# Altium footprint library ConnectMedical_BAC.PcbLib: 83 footprints (part 5 of 6)
Each footprint in its own frame and in the unit in brackets; x right, y up, seen from the top. Pads: shape width x height; smd on the part's side, far side on the other; paste and mask are expansions set on the pad; w line width, h text height; cw(c..) or ccw(c..) is an arc to the next point about the centre after c.
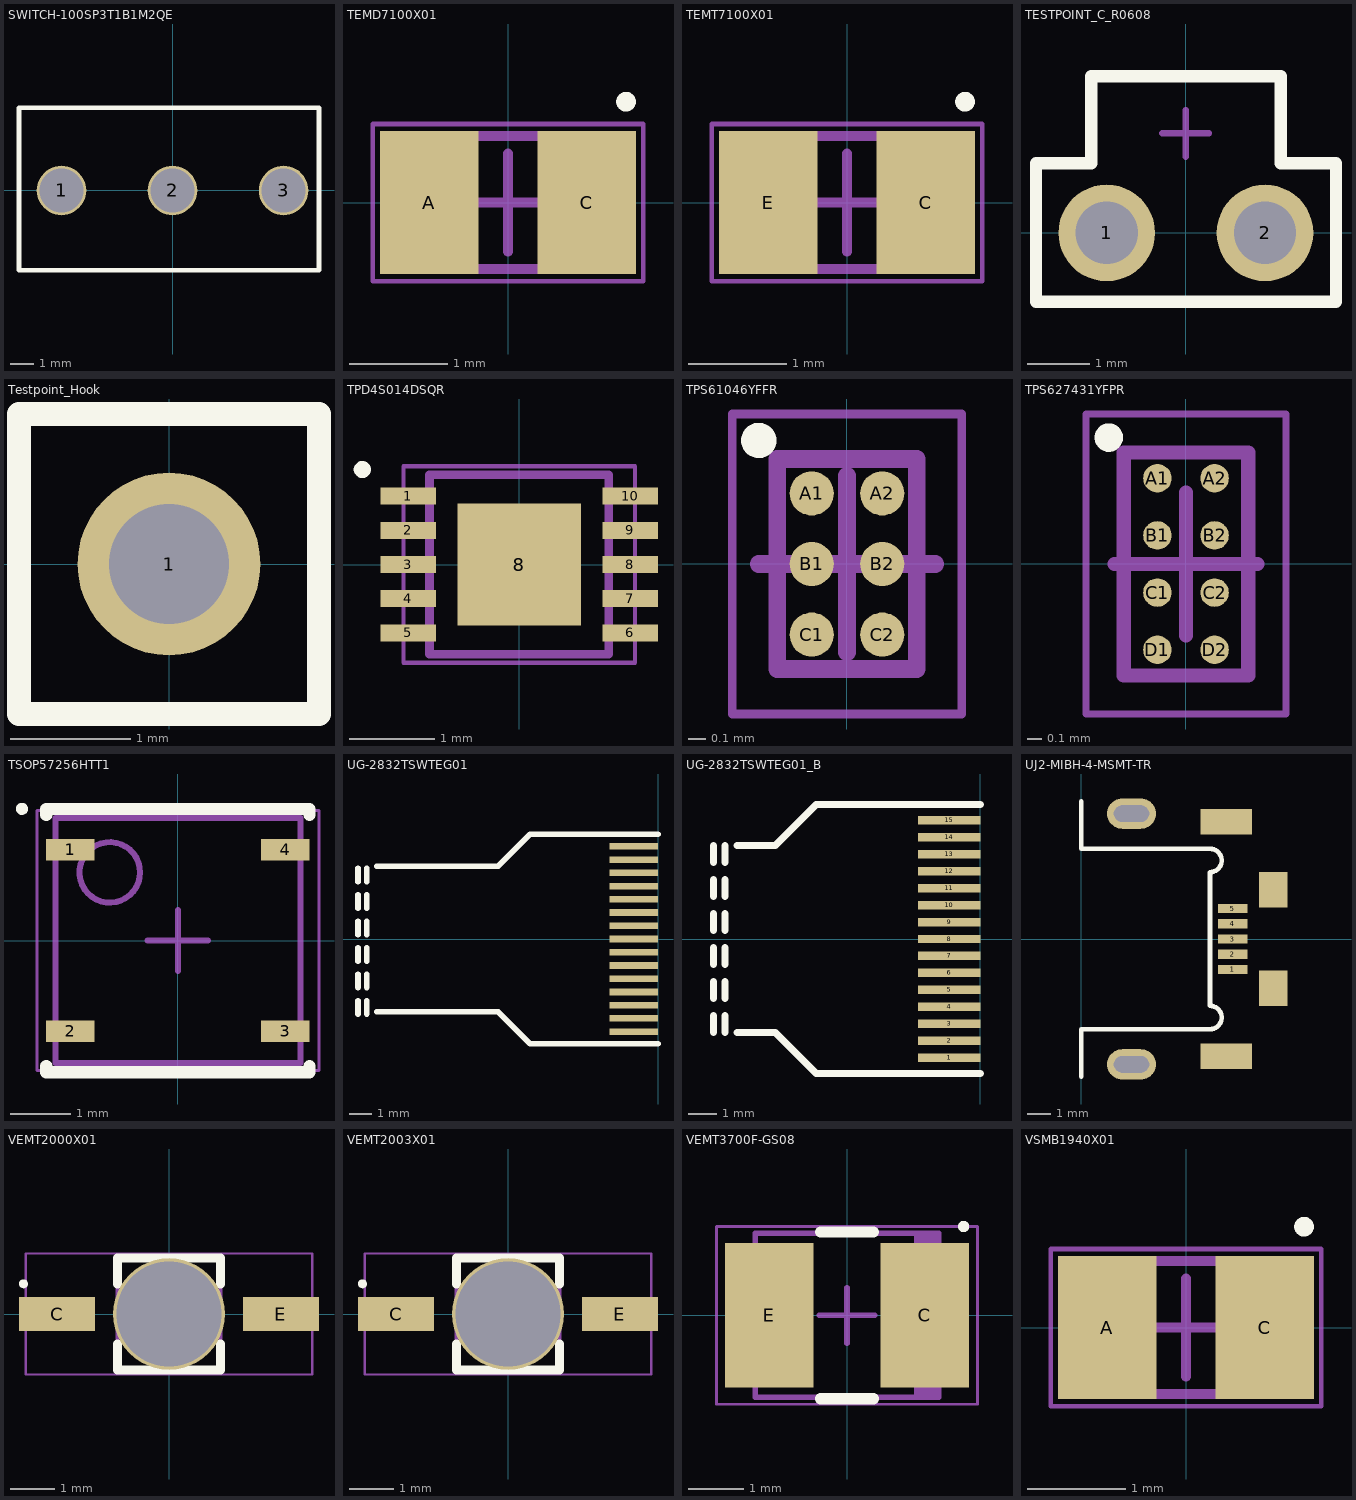
[diagram p4: the footprints below, top view; thin cyan lines are the x and y axes]

## SWITCH-100SP3T1B1M2QE [mm] "SWITCH TOGGLE SPDT"
pads (3):
  round 2.1 hole 1.85 paste-3 mask+0.1: 1(-4.7,0) 2(0,0) 3(4.7,0)
Top Overlay:
  lines w0.2: -6.5,-3.375 6.2,-3.375 6.2,3.5 -6.5,3.5 -6.5,-3.375
3D body "100SPxT1B1M2xE.stp": height 29.46, standoff -5.06, extent -6.5,-3.38 6.2,3.48

## TEMD7100X01 [mm] "Silicon PIN Photodiode, 2-Leads, Body 2.00x1.25mm, IPC High Density"
height 0.95
pads (2):
  rect 1x1.45 smd: A(-0.8,0) C(0.8,0)
Top Overlay:
  circle w0.1: c1.2,1.025 r0.05
Mechanical 13:
  rectangle: 0.768,-0.675 1.05,0.675
  lines w0.1: -1.05,-0.675 1.05,-0.675 1.05,0.675 -1.05,0.675 -1.05,-0.675
Mechanical 15:
  lines w0.05: -1.375,-0.8 1.375,-0.8 1.375,0.8 -1.375,0.8 -1.375,-0.8
  lines w0.1: -0.5,0 0.5,0 ; 0,-0.5 0,0.5
3D body "TEMD7100X01 .step": height 0.95, standoff 0, extent -1.27,-0.675 1.27,0.675

## TEMT7100X01 [mm] "Silicon Phototransistor in 0805 Package, 2-Leads, Body 2.00x1.25mm, IPC High Density"
height 0.95
pads (2):
  rect 1x1.45 smd: C(0.8,0) E(-0.8,0)
Top Overlay:
  circle w0.1: c1.2,1.025 r0.05
Mechanical 13:
  rectangle: 0.768,-0.675 1.05,0.675
  lines w0.1: -1.05,-0.675 1.05,-0.675 1.05,0.675 -1.05,0.675 -1.05,-0.675
Mechanical 15:
  lines w0.05: -1.375,-0.8 1.375,-0.8 1.375,0.8 -1.375,0.8 -1.375,-0.8
  lines w0.1: -0.5,0 0.5,0 ; 0,-0.5 0,0.5
3D body "TEMD7100X01 .step": height 0.95, standoff 0, extent -1.27,-0.675 1.27,0.675

## TESTPOINT_C_R0608 [mm] "Testpoint current"
pads (2):
  round 1.55 hole 1 paste-3 mask+0.1: 1(-1.27,0) 2(1.27,0)
Top Overlay:
  lines w0.2: -2.405,-1.107 2.408,-1.107 2.408,1.115 1.52,1.115 1.52,2.516 -1.52,2.516 -1.52,1.115 -2.405,1.115 -2.405,-1.107
Mechanical 15:
  lines w0.05: -1.353,2.447 1.347,2.447
  lines w0.1: -0.378,1.597 0.372,1.597 ; -0.003,1.222 -0.003,1.972

## Testpoint_Hook [mil] "Testpoints"
pads (1):
  round 60 hole 39.37: 1(0,0)
Top Overlay:
  lines w7.87: -49.21,-49.21 -49.21,49.21 49.21,49.21 49.21,-49.21 -49.21,-49.21
3D body "TEST POINT GRY Keystone 5118.STEP": height 192.34, standoff -121.02, extent -49.99,-49.99 50.01,50.01

## TPD4S014DSQR [mm] "IC USB PORT PROTECTION 10SON"
height 0.8
pads (11):
  rect 0.65x0.2 smd mask+0.07: 1(-1.3,0.8) 2(-1.3,0.4) 3(-1.3,0) 4(-1.3,-0.4) 5(-1.3,-0.8) 6(1.3,-0.8) 7(1.3,-0.4) 8(1.3,0) 9(1.3,0.4) 10(1.3,0.8)
  rect 1.45x1.43 smd mask+0.07: 8(0,0)
Top Overlay:
  circle w0.1: c-1.837,1.112 r0.05
Mechanical 13:
  circle w0.1: c-0.25,0.25 r0.4
  lines w0.1: -1.05,-1.05 -1.05,1.05 1.05,1.05 1.05,-1.05 -1.05,-1.05
Mechanical 15:
  lines w0.05: -1.355,-1.15 -1.355,1.15 1.355,1.15 1.355,-1.15 -1.355,-1.15
  lines w0.1: -0.5,0 0.5,0 ; 0,-0.5 0,0.5
3D body "TPD4S014DSQR.step": height 0.8, standoff 0, extent -1.1,-1.05 1.1,1.05

## TPS61046YFFR [mm] "IC LED DRVR RGLTR DIM"
height 0.63
pads (6):
  round 0.25 smd mask+0.07: A1(-0.2,0.4) A2(0.2,0.4) B1(-0.2,0) B2(0.2,0) C1(-0.2,-0.4) C2(0.2,-0.4)
Top Overlay:
  circle w0.1: c-0.5,0.7 r0.05
Mechanical 13:
  lines w0.1: -0.395,-0.595 -0.395,0.595 0.395,0.595 0.395,-0.595 -0.395,-0.595
Mechanical 15:
  lines w0.05: -0.65,-0.85 -0.65,0.85 0.65,0.85 0.65,-0.85 -0.65,-0.85
  lines w0.1: -0.5,0 0.5,0 ; 0,-0.5 0,0.5
3D body "TPS61046YFFR.step": height 0.63, standoff 0, extent -0.395,-0.595 0.395,0.595

## TPS627431YFPR [mm] "IC REG BCK PROG 0.4A SYNC 8DSBGA"
height 0.5
pads (8):
  round 0.2 smd mask+0.07: A1(-0.2,0.6) A2(0.2,0.6) B1(-0.2,0.2) B2(0.2,0.2) C1(-0.2,-0.2) C2(0.2,-0.2) D1(-0.2,-0.6) D2(0.2,-0.6)
Top Overlay:
  circle w0.1: c-0.54,0.885 r0.05
Mechanical 13:
  lines w0.1: -0.435,-0.78 0.435,-0.78 0.435,0.78 -0.435,0.78 -0.435,-0.78
Mechanical 15:
  lines w0.05: -0.7,-1.05 0.7,-1.05 0.7,1.05 -0.7,1.05 -0.7,-1.05
  lines w0.1: -0.5,0 0.5,0 ; 0,-0.5 0,0.5
3D body "TPS627431YFPR.step": height 0.5, standoff 0, extent -0.435,-0.78 0.435,0.78

## TSOP57256HTT1 [mm] "IR Receiver Modules ,SON, 4-Leads, Body 3.95x3.95mm, Pitch 3.00mm, IPC High Density"
height 0.9
pads (4):
  rect 0.8x0.35 smd: 1(-1.775,1.5) 2(-1.775,-1.5) 3(1.775,-1.5) 4(1.775,1.5)
Top Overlay:
  circle w0.1: c-2.575,2.175 r0.05
  lines w0.2: -2.175,-2.075 -2.175,-2.175 2.175,-2.175 2.175,-2.075 ; -2.175,2.075 -2.175,2.175 2.175,2.175 2.175,2.075
Mechanical 13:
  circle w0.1: c-1.125,1.125 r0.5
  lines w0.1: -2.025,-2.025 -2.025,2.025 2.025,2.025 2.025,-2.025 -2.025,-2.025
Mechanical 15:
  lines w0.05: -2.33,-2.15 -2.33,2.15 2.33,2.15 2.33,-2.15 -2.33,-2.15
  lines w0.1: -0.5,0 0.5,0 ; 0,-0.5 0,0.5
3D body "TSOP57256HTT1.step": height 0.9, standoff 0, extent -2.075,-2.025 2.075,2.025

## UG-2832TSWTEG01 [mm] "OLED Display"
pads (15):
  rect 2.2x0.3 smd: 1(-1.1,-4.2) 2(-1.1,-3.6) 3(-1.1,-3) 4(-1.1,-2.4) 5(-1.1,-1.8) 6(-1.1,-1.2) 7(-1.1,-0.6) 8(-1.1,0) 9(-1.1,0.6) 10(-1.1,1.2) 11(-1.1,1.8) 12(-1.1,2.4) 13(-1.1,3) 14(-1.1,3.6) 15(-1.1,4.2)
Top Overlay:
  lines w0.254: -13.6,-3.4 -13.6,-2.8 ; -13.6,-2.2 -13.6,-1.6 ; -13.6,-1 -13.6,-0.4 ; -13.6,0.2 -13.6,0.8 ; -13.6,1.4 -13.6,2 ; -13.6,2.6 -13.6,3.2 ; -13.2,-3.4 -13.2,-2.8 ; -13.2,-2.2 -13.2,-1.6 ; -13.2,-1 -13.2,-0.4 ; -13.2,0.2 -13.2,0.8 ; -13.2,1.4 -13.2,2 ; -13.2,2.6 -13.2,3.2 ; -12.75,-3.3 -7.25,-3.3 -5.8,-4.75 0,-4.75 ; -12.75,3.3 -7.25,3.3 -5.8,4.75 0,4.75

## UG-2832TSWTEG01_B [mm] "OLED Display"
pads (15):
  rect 2.2x0.3 smd: 1(-1.1,-4.2) 2(-1.1,-3.6) 3(-1.1,-3) 4(-1.1,-2.4) 5(-1.1,-1.8) 6(-1.1,-1.2) 7(-1.1,-0.6) 8(-1.1,0) 9(-1.1,0.6) 10(-1.1,1.2) 11(-1.1,1.8) 12(-1.1,2.4) 13(-1.1,3) 14(-1.1,3.6) 15(-1.1,4.2)
Top Overlay:
  lines w0.254: -9.425,-3.3 -9.425,-2.7 ; -9.425,-2.1 -9.425,-1.5 ; -9.425,-0.9 -9.425,-0.3 ; -9.425,0.3 -9.425,0.9 ; -9.425,1.5 -9.425,2.1 ; -9.425,2.7 -9.425,3.3 ; -9.025,-3.3 -9.025,-2.7 ; -9.025,-2.1 -9.025,-1.5 ; -9.025,-0.9 -9.025,-0.3 ; -9.025,0.3 -9.025,0.9 ; -9.025,1.5 -9.025,2.1 ; -9.025,2.7 -9.025,3.3 ; -8.6,-3.3 -7.25,-3.3 -5.8,-4.75 0,-4.75 ; -8.6,3.3 -7.25,3.3 -5.8,4.75 0,4.75

## UJ2-MIBH-4-MSMT-TR [mm] "USB Connector"
pads (11):
  rect 1.25x0.4 smd: 1(6.475,-1.3) 2(6.475,-0.65) 3(6.475,0) 4(6.475,0.65) 5(6.475,1.3)
  oval 2.1x1.3 hole 0.7 slot 1.5 at 0 deg: ""(2.15,-5.35) ""(2.15,5.35)
  rect 2.2x1.1 smd: ""(6.2,-5) ""(6.2,5)
  rect 1.2x1.5 smd: ""(8.2,-2.1) ""(8.2,2.1)
Top Overlay:
  lines w0.2: 0,-5.875 0,-3.85 5.5,-3.85 ccw(c5.5,-3.35) 5.5,-2.85 5.5,2.85 ccw(c5.5,3.35) 5.5,3.85 0,3.85 0,5.875
3D body "UJ2-MIBH-4-MSMT_AP203.stp": height 0.9, standoff -1.81, extent 0.025,-5.5 8.725,5.5

## VEMT2000X01 [mm] "Silicon NPN Phototransistor, 2-Leads, Body 2.30x5.80mm, IPC High Density"
height 2.97
pads (3):
  rect 1.7x0.75 smd: C(-2.5,0) E(2.5,0)
  round 2.5 hole 2.35: ""(0,0)
Top Overlay:
  circle w0.1: c-3.25,0.675 r0.05
  lines w0.2: -1.15,-0.675 -1.15,-1.25 1.15,-1.25 1.15,-0.675 ; -1.15,0.675 -1.15,1.25 1.15,1.25 1.15,0.675
Mechanical 13:
  lines w0.1: -1.15,-1.25 1.15,-1.25 1.15,1.25 -1.15,1.25 -1.15,-1.25
Mechanical 15:
  lines w0.05: -3.2,-1.35 3.2,-1.35 3.2,1.35 -3.2,1.35 -3.2,-1.35
  lines w0.1: -0.5,0 0.5,0 ; 0,-0.5 0,0.5
3D body "VEMT2000x01.step": height 1.8, standoff -0.97, extent -2.9,-1.15 2.9,1.15

## VEMT2003X01 [mm] "Silicon NPN Phototransistor, SODFL, 2-Leads, Body 2.30x5.80mm, IPC High Density"
height 2.75
pads (3):
  rect 1.7x0.75 smd: C(-2.5,0) E(2.5,0)
  round 2.5 hole 2.35: ""(0,0)
Top Overlay:
  circle w0.1: c-3.25,0.675 r0.05
  lines w0.2: -1.15,-0.675 -1.15,-1.25 1.15,-1.25 1.15,-0.675 ; -1.15,0.675 -1.15,1.25 1.15,1.25 1.15,0.675
Mechanical 13:
  lines w0.1: -1.15,-1.25 1.15,-1.25 1.15,1.25 -1.15,1.25 -1.15,-1.25
Mechanical 15:
  lines w0.05: -3.2,-1.35 3.2,-1.35 3.2,1.35 -3.2,1.35 -3.2,-1.35
  lines w0.1: -0.5,0 0.5,0 ; 0,-0.5 0,0.5
3D body "VEMT2003x01.step": height 1.6, standoff -0.95, extent -2.9,-1.15 2.9,1.15

## VEMT3700F-GS08 [mm] "Silicon NPN Phototransistor, 2-Leads, Body 3.50x2.80mm, IPC High Density"
height 1.85
pads (2):
  rect 1.6x2.6 smd: C(1.4,0) E(-1.4,0)
Top Overlay:
  circle w0.1: c2.1,1.6 r0.05
  lines w0.2: -0.475,-1.5 0.475,-1.5 ; -0.475,1.5 0.475,1.5
Mechanical 13:
  rectangle: 1.206,-1.475 1.65,1.475
  lines w0.1: -1.65,-1.475 1.65,-1.475 1.65,1.475 -1.65,1.475 -1.65,-1.475
Mechanical 15:
  lines w0.05: -2.35,-1.6 2.35,-1.6 2.35,1.6 -2.35,1.6 -2.35,-1.6
  lines w0.1: -0.5,0 0.5,0 ; 0,-0.5 0,0.5
3D body "VSML3710-GS08.step": height 1.85, standoff 0, extent -1.87,-1.475 1.87,1.475

## VSMB1940X01 [mm] "High Speed Infrared Emitting Diode, 2-Leads, Body 2.00x1.25mm, IPC High Density"
height 0.95
pads (2):
  rect 1x1.45 smd: A(-0.8,0) C(0.8,0)
Top Overlay:
  circle w0.1: c1.2,1.025 r0.05
Mechanical 13:
  rectangle: 0.768,-0.675 1.05,0.675
  lines w0.1: -1.05,-0.675 -1.05,0.675 1.05,0.675 1.05,-0.675 -1.05,-0.675
Mechanical 15:
  lines w0.05: -1.375,-0.8 -1.375,0.8 1.375,0.8 1.375,-0.8 -1.375,-0.8
  lines w0.1: -0.5,0 0.5,0 ; 0,-0.5 0,0.5
3D body "TEMD7100X01 .step": height 0.95, standoff 0, extent -1.27,-0.675 1.27,0.675